# Altium footprint library RPSLib.PcbLib: 199 footprints (part 7 of 13)
Each footprint in its own frame and in the unit in brackets; x right, y up, seen from the top. Pads: shape width x height; smd on the part's side, far side on the other; paste and mask are expansions set on the pad; w line width, h text height; cw(c..) or ccw(c..) is an arc to the next point about the centre after c.
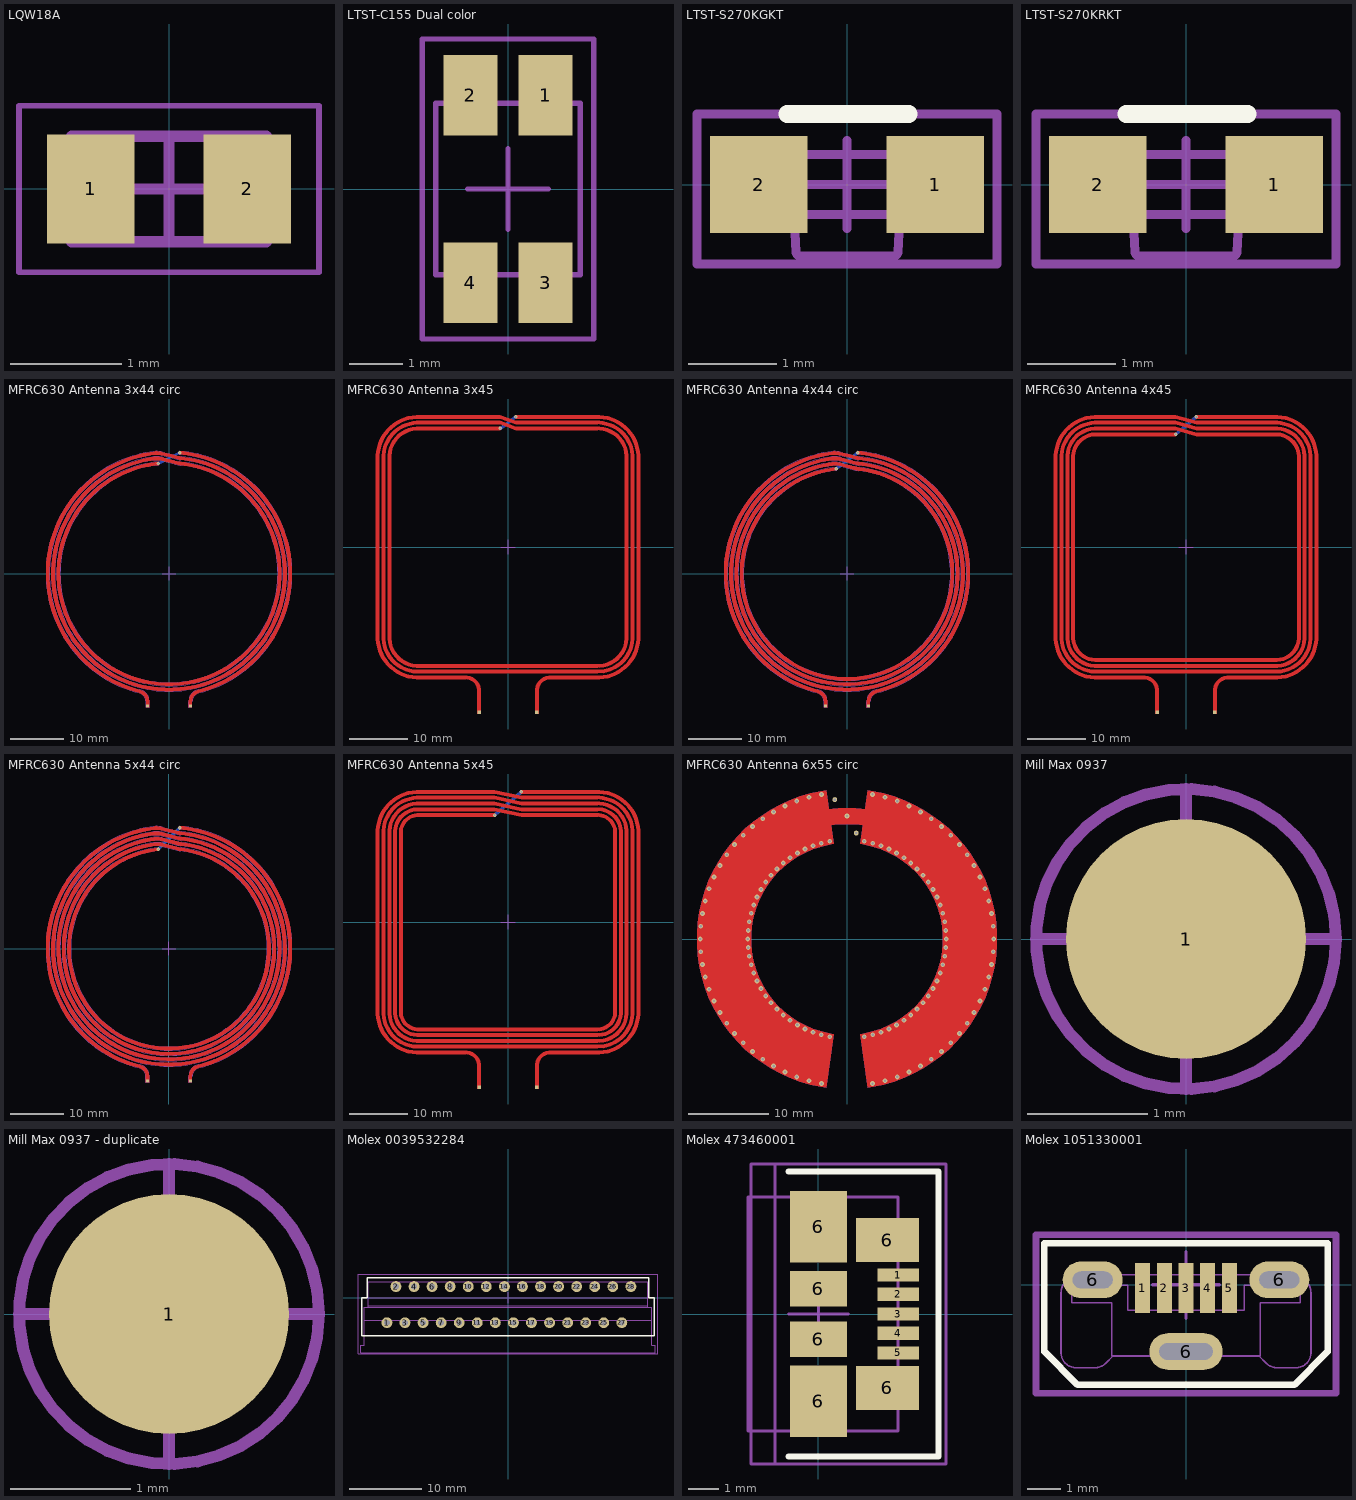
[diagram p6: the footprints below, top view; thin cyan lines are the x and y axes]

## LQW18A [mm] "Chip Inductor, 2-Leads, Body 1.60x0.80mm, IPC Medium Density"
height 0.8
pads (2):
  rect 0.79x0.98 smd paste-0.05 mask+0.07: 1(-0.705,0) 2(0.705,0)
Mechanical 13:
  lines w0.1: -0.875,-0.475 -0.875,0.475 0.875,0.475 0.875,-0.475 -0.875,-0.475
Mechanical 15:
  lines w0.05: -1.35,-0.75 -1.35,0.75 1.35,0.75 1.35,-0.75 -1.35,-0.75
  lines w0.1: -0.475,0 0.475,0 ; 0,-0.475 0,0.475
3D body "User Library-INDC1608X80-MURATA_LQW18A.step": height 0.81, standoff 0, extent -0.8,-0.45 0.8,0.45

## LTST-C155 Dual color [mm] "Dual color LED"
height 1.1
pads (4):
  rect 1x1.5 smd mask+0.07: 1(0.7,1.75) 2(-0.7,1.75) 3(0.7,-1.75) 4(-0.7,-1.75)
Mechanical 13:
  lines w0.1: -1.35,-1.6 1.35,-1.6 1.35,1.6 -1.35,1.6 -1.35,-1.6
Mechanical 15:
  lines w0.1: -0.75,0 0.75,0 ; 0,-0.75 0,0.75 ; -1.6,-2.8 -1.6,2.8 1.6,2.8 1.6,-2.8 -1.6,-2.8

## LTST-S270KGKT [mm] "LED Green Right Angle"
height 0.6
pads (2):
  rect 1.1x1.1 smd: 1(1,0) 2(-1,0)
Top Overlay:
  lines w0.2: -0.678,0.8 0.7,0.8
Mechanical 13:
  lines w0.1: -0.6,0.34 -0.6,-0.34 ; -0.528,-0.811 0,-0.811 0.528,-0.811 ; -0.528,-0.81 cw(c-0.528,-0.76) -0.578,-0.763 -0.6,-0.34 ; 0.528,-0.81 ccw(c0.528,-0.76) 0.578,-0.763 0.6,-0.34 ; 0.6,0.34 0.6,-0.34 ; -0.6,-0.34 0.6,-0.34 ; -0.6,-0.34 -0.77,-0.34 -0.825,-0.34 -0.825,0.34 -0.77,0.34 -0.495,0.34 0,0.34 0.495,0.34 0.77,0.34 0.825,0.34 0.825,-0.34 0.77,-0.34 0.6,-0.34
Mechanical 15:
  lines w0.1: -0.5,0 0.5,0 ; 0,-0.5 0,0.5 ; -1.7,-0.9 1.7,-0.9 1.7,0.8 -1.7,0.8 -1.7,-0.9
3D body "LTST-S270KGKT.stp": height 0.6, standoff 0, extent -0.825,-0.811 0.825,0.34

## LTST-S270KRKT [mm] "LED Red Right Angle"
height 0.6
pads (2):
  rect 1.1x1.1 smd: 1(1,0) 2(-1,0)
Top Overlay:
  lines w0.2: -0.678,0.8 0.7,0.8
Mechanical 13:
  lines w0.1: -0.6,0.34 -0.6,-0.34 ; -0.528,-0.811 0,-0.811 0.528,-0.811 ; -0.528,-0.81 cw(c-0.528,-0.76) -0.578,-0.763 -0.6,-0.34 ; 0.528,-0.81 ccw(c0.528,-0.76) 0.578,-0.763 0.6,-0.34 ; 0.6,0.34 0.6,-0.34 ; -0.6,-0.34 0.6,-0.34 ; -0.6,-0.34 -0.77,-0.34 -0.825,-0.34 -0.825,0.34 -0.77,0.34 -0.495,0.34 0,0.34 0.495,0.34 0.77,0.34 0.825,0.34 0.825,-0.34 0.77,-0.34 0.6,-0.34
Mechanical 15:
  lines w0.1: -0.5,0 0.5,0 ; 0,-0.5 0,0.5 ; -1.7,-0.9 1.7,-0.9 1.7,0.8 -1.7,0.8 -1.7,-0.9
3D body "LTST-S270KRKT.stp": height 0.6, standoff 0, extent -0.825,-0.811 0.825,0.34

## MFRC630 Antenna 3x44 circ [mm] "Антенна 3 витка 44 мм"
pads (2):
  rect 0.6x0.6 smd mask+0.07: 1(-4,-24.75) 2(4,-24.75)
via 2,22.612 diameter 0.6 hole 0.3
via -2,20.603 diameter 0.6 hole 0.3
Top Layer:
  region: 3.7,-25 3.7,-23.96 3.7,-23.769 3.763,-23.393 3.887,-23.031 4.069,-22.696 4.304,-22.395 4.586,-22.136 4.906,-21.928 5.256,-21.775 5.441,-21.729 6.158,-21.537 7.571,-21.082 8.95,-20.534 10.291,-19.896 11.586,-19.171 12.83,-18.362 14.018,-17.472 15.144,-16.505 16.204,-15.466 17.192,-14.359 18.105,-13.189 18.939,-11.961 19.69,-10.681 20.354,-9.353 20.928,-7.985 21.411,-6.582 21.8,-5.149 22.093,-3.694 22.289,-2.223 22.388,-0.742 22.4,0 22.389,0.692 22.304,2.073 22.133,3.446 21.878,4.805 21.54,6.147 21.12,7.465 20.618,8.755 20.039,10.011 19.382,11.229 18.652,12.404 17.851,13.532 16.981,14.608 16.047,15.628 15.052,16.589 13.999,17.487 12.893,18.318 11.737,19.079 10.537,19.767 9.297,20.38 8.021,20.915 6.714,21.37 5.382,21.744 4.03,22.035 2.662,22.241 1.974,22.313 2.026,22.911 2.734,22.848 4.14,22.636 5.529,22.337 6.898,21.953 8.24,21.485 9.55,20.936 10.825,20.306 12.057,19.599 13.244,18.817 14.381,17.964 15.462,17.042 16.485,16.055 17.445,15.006 18.338,13.901 19.161,12.742 19.911,11.535 20.585,10.284 21.181,8.993 21.696,7.669 22.128,6.315 22.475,4.937 22.737,3.54 22.912,2.129 23,0.711 23,0 23,-0.762 22.899,-2.284 22.698,-3.795 22.396,-5.29 21.997,-6.762 21.501,-8.203 20.91,-9.609 20.228,-10.973 19.457,-12.288 18.601,-13.55 17.662,-14.752 16.647,-15.889 15.558,-16.957 14.401,-17.95 13.181,-18.864 11.902,-19.696 10.572,-20.441 9.195,-21.096 7.778,-21.658 6.327,-22.126 5.587,-22.311 5.452,-22.351 5.194,-22.463 4.958,-22.617 4.751,-22.807 4.578,-23.029 4.444,-23.276 4.352,-23.542 4.306,-23.82 4.3,-23.96 4.3,-25
  region: 578 vertices and 0 holes, not listed, extent -23,-25 22,22.864
Bottom Layer:
  lines w0.6: -2,20.603 2,22.612
Mechanical 1:
  lines w0.1: -23,0 cw(c0,0) -2.813,22.827 cw(c-2.287,18.56) -1.24,22.73 0.073,22.401 1.787,21.97 ccw(c2.688,25.559) 2.301,21.879 cw(c0,0) 22,0 cw(c0,0) 0,-22 cw(c0,0) -22,0 cw(c0,0) -2.83,21.817 cw(c-2.277,17.553) -1.23,21.723 0.073,21.396 1.796,20.964 ccw(c2.697,24.552) 2.293,20.874 cw(c0,0) 21,0 cw(c0,0) 0,-21 cw(c0,0) -21,0 cw(c0,0) -2.029,20.902 -1.971,20.305 ccw(c0,0) -20.4,0 ccw(c0,0) 0,-20.4 ccw(c0,0) 20.4,0 ccw(c0,0) 2.228,20.278 cw(c2.697,24.552) 1.65,20.382 -0.073,20.814 -1.376,21.142 ccw(c-2.277,17.553) -2.753,21.222 ccw(c0,0) -21.4,0 ccw(c0,0) 0,-21.4 ccw(c0,0) 21.4,0 ccw(c0,0) 2.238,21.283 cw(c2.688,25.559) 1.641,21.388 -0.073,21.819 -1.386,22.148 ccw(c-2.287,18.56) -2.739,22.232 ccw(c0,0) -22.4,0 ccw(c0,0) -5.441,-21.729 cw(c-6,-23.96) -3.7,-23.96 -3.7,-25 -4.3,-25 -4.3,-23.96 ccw(c-6,-23.96) -5.587,-22.311 cw(c0,0) -23,0 ; 1.974,22.313 cw(c0,0) 22.4,0 cw(c0,0) 5.441,-21.729 ccw(c6,-23.96) 3.7,-23.96 3.7,-25 4.3,-25 4.3,-23.96 cw(c6,-23.96) 5.587,-22.311 ccw(c0,0) 23,0 ccw(c0,0) 2.026,22.911 1.974,22.313
Mechanical 15:
  lines w0.2: -1.25,0 1.25,0 ; 0,-1.25 0,1.25

## MFRC630 Antenna 3x45 [mm] "Антенна 3 витка 45 мм"
pads (2):
  rect 0.6x0.6 smd mask+0.07: 1(-5,-28.5) 2(5,-28.5)
via 1.3,22.5 diameter 0.6 hole 0.3
via -1.3,20.5 diameter 0.6 hole 0.3
Top Layer:
  region: 370 vertices and 0 holes, not listed, extent -22.8,-28.8 21.8,22.8
  region: 5.3,-28.8 5.3,-24.8 5.31,-24.604 5.386,-24.219 5.536,-23.857 5.754,-23.531 6.031,-23.254 6.357,-23.036 6.719,-22.886 7.104,-22.81 7.3,-22.8 15.5,-22.8 15.859,-22.8 16.572,-22.73 17.276,-22.59 17.962,-22.382 18.625,-22.107 19.257,-21.769 19.854,-21.37 20.408,-20.915 20.915,-20.408 21.37,-19.854 21.769,-19.257 22.107,-18.625 22.382,-17.962 22.59,-17.276 22.73,-16.572 22.8,-15.859 22.8,-15.5 22.8,15.5 22.8,15.859 22.73,16.572 22.59,17.276 22.382,17.962 22.107,18.625 21.769,19.257 21.37,19.854 20.915,20.408 20.408,20.915 19.854,21.37 19.257,21.769 18.625,22.107 17.962,22.382 17.276,22.59 16.572,22.73 15.859,22.8 15.5,22.8 1.3,22.8 1.3,22.2 15.5,22.2 15.829,22.192 16.483,22.127 17.128,21.999 17.757,21.808 18.365,21.557 18.944,21.247 19.491,20.881 19.999,20.464 20.464,19.999 20.881,19.491 21.247,18.944 21.557,18.365 21.808,17.757 21.999,17.128 22.127,16.483 22.192,15.829 22.2,15.5 22.2,-15.5 22.192,-15.829 22.127,-16.483 21.999,-17.128 21.808,-17.757 21.557,-18.365 21.247,-18.944 20.881,-19.491 20.464,-19.999 19.999,-20.464 19.491,-20.881 18.944,-21.247 18.365,-21.557 17.757,-21.808 17.128,-21.999 16.483,-22.127 15.829,-22.192 15.5,-22.2 7.3,-22.2 7.044,-22.2 6.542,-22.3 6.068,-22.496 5.643,-22.78 5.28,-23.143 4.996,-23.568 4.8,-24.042 4.7,-24.544 4.7,-24.8 4.7,-28.8
Bottom Layer:
  lines w0.6: -1.3,20.5 1.3,22.5
Top Solder:
  rectangle: -2.4,20 2.7,23
Mechanical 15:
  lines w0.2: -1.25,0 1.25,0 ; 0,-1.25 0,1.25

## MFRC630 Antenna 4x44 circ [mm] "Антенна 4витка 44 мм"
pads (2):
  rect 0.6x0.6 smd mask+0.07: 1(-4,-24.75) 2(4,-24.75)
via -2,19.598 diameter 0.6 hole 0.3
via 2,22.612 diameter 0.6 hole 0.3
Top Layer:
  region: 805 vertices and 0 holes, not listed, extent -23,-25 22,22.864
  region: 3.7,-25 4.3,-25 4.3,-23.96 4.306,-23.82 4.352,-23.542 4.444,-23.276 4.578,-23.029 4.751,-22.807 4.958,-22.617 5.194,-22.463 5.452,-22.351 5.587,-22.311 6.327,-22.126 7.778,-21.658 9.195,-21.096 10.572,-20.441 11.902,-19.696 13.181,-18.864 14.401,-17.95 15.558,-16.957 16.647,-15.889 17.662,-14.752 18.601,-13.55 19.457,-12.288 20.228,-10.973 20.91,-9.609 21.501,-8.203 21.997,-6.762 22.396,-5.29 22.698,-3.795 22.899,-2.284 23,-0.762 23,0 23,0.711 22.912,2.129 22.737,3.54 22.475,4.937 22.128,6.315 21.696,7.669 21.181,8.993 20.585,10.284 19.911,11.535 19.161,12.742 18.338,13.901 17.445,15.006 16.485,16.055 15.462,17.042 14.381,17.964 13.244,18.817 12.057,19.599 10.825,20.306 9.55,20.936 8.24,21.485 6.898,21.953 5.529,22.337 4.14,22.636 2.734,22.848 2.026,22.911 1.974,22.313 2.662,22.241 4.03,22.035 5.382,21.744 6.714,21.37 8.021,20.915 9.297,20.38 10.537,19.767 11.737,19.079 12.893,18.318 13.999,17.487 15.052,16.589 16.047,15.628 16.981,14.608 17.851,13.532 18.652,12.404 19.382,11.229 20.039,10.011 20.618,8.755 21.12,7.465 21.54,6.147 21.878,4.805 22.133,3.446 22.304,2.073 22.389,0.692 22.4,0 22.388,-0.742 22.289,-2.223 22.093,-3.694 21.8,-5.149 21.411,-6.582 20.928,-7.985 20.354,-9.353 19.69,-10.681 18.939,-11.961 18.105,-13.189 17.192,-14.359 16.204,-15.466 15.144,-16.505 14.018,-17.472 12.83,-18.362 11.586,-19.171 10.291,-19.896 8.95,-20.534 7.571,-21.082 6.158,-21.537 5.441,-21.729 5.256,-21.775 4.906,-21.928 4.586,-22.136 4.304,-22.395 4.069,-22.696 3.887,-23.031 3.763,-23.393 3.7,-23.769 3.7,-23.96
Bottom Layer:
  lines w0.6: -2,19.598 2,22.612
Mechanical 1:
  lines w0.1: -23,0 cw(c0,0) -2.813,22.827 cw(c-2.287,18.56) -1.24,22.73 0.073,22.401 1.787,21.97 ccw(c2.688,25.559) 2.301,21.879 cw(c0,0) 22,0 cw(c0,0) 0,-22 cw(c0,0) -22,0 cw(c0,0) -2.83,21.817 cw(c-2.277,17.553) -1.23,21.723 0.073,21.396 1.796,20.964 ccw(c2.697,24.552) 2.293,20.874 cw(c0,0) 21,0 cw(c0,0) 0,-21 cw(c0,0) -21,0 cw(c0,0) -2.849,20.806 cw(c-2.266,16.546) -1.218,20.716 0.073,20.392 1.805,19.956 ccw(c2.707,23.545) 2.284,19.869 cw(c0,0) 20,0 cw(c0,0) 0,-20 cw(c0,0) -20,0 cw(c0,0) -2.03,19.897 -1.97,19.3 ccw(c0,0) -19.4,0 ccw(c0,0) 0,-19.4 ccw(c0,0) 19.4,0 ccw(c0,0) 2.216,19.273 cw(c2.707,23.545) 1.659,19.374 -0.073,19.81 -1.364,20.134 ccw(c-2.266,16.546) -2.768,20.211 ccw(c0,0) -20.4,0 ccw(c0,0) 0,-20.4 ccw(c0,0) 20.4,0 ccw(c0,0) 2.228,20.278 cw(c2.697,24.552) 1.65,20.382 -0.073,20.814 -1.376,21.142 ccw(c-2.277,17.553) -2.753,21.222 ccw(c0,0) -21.4,0 ccw(c0,0) 0,-21.4 ccw(c0,0) 21.4,0 ccw(c0,0) 2.238,21.283 cw(c2.688,25.559) 1.641,21.388 -0.073,21.819 -1.386,22.148 ccw(c-2.287,18.56) -2.739,22.232 ccw(c0,0) -22.4,0 ccw(c0,0) -5.441,-21.729 cw(c-6,-23.96) -3.7,-23.96 -3.7,-25 -4.3,-25 -4.3,-23.96 ccw(c-6,-23.96) -5.587,-22.311 cw(c0,0) -23,0 ; 1.974,22.313 cw(c0,0) 22.4,0 cw(c0,0) 5.441,-21.729 ccw(c6,-23.96) 3.7,-23.96 3.7,-25 4.3,-25 4.3,-23.96 cw(c6,-23.96) 5.587,-22.311 ccw(c0,0) 23,0 ccw(c0,0) 2.026,22.911 1.974,22.313
Mechanical 15:
  lines w0.2: -1.25,0 1.25,0 ; 0,-1.25 0,1.25

## MFRC630 Antenna 4x45 [mm] "Антенна 4 витка 45 мм"
pads (2):
  rect 0.6x0.6 smd mask+0.07: 1(-5,-28.5) 2(5,-28.5)
via 1.8,22.5 diameter 0.6 hole 0.3
via -1.8,19.5 diameter 0.6 hole 0.3
Top Layer:
  region: 499 vertices and 0 holes, not listed, extent -22.8,-28.8 21.8,22.8
  region: 4.7,-28.8 5.3,-28.8 5.3,-24.8 5.31,-24.604 5.386,-24.219 5.536,-23.857 5.754,-23.531 6.031,-23.254 6.357,-23.036 6.719,-22.886 7.104,-22.81 7.3,-22.8 15.5,-22.8 15.859,-22.8 16.572,-22.73 17.276,-22.59 17.962,-22.382 18.625,-22.107 19.257,-21.769 19.854,-21.37 20.408,-20.915 20.915,-20.408 21.37,-19.854 21.769,-19.257 22.107,-18.625 22.382,-17.962 22.59,-17.276 22.73,-16.572 22.8,-15.859 22.8,-15.5 22.8,15.5 22.8,15.859 22.73,16.572 22.59,17.276 22.382,17.962 22.107,18.625 21.769,19.257 21.37,19.854 20.915,20.408 20.408,20.915 19.854,21.37 19.257,21.769 18.625,22.107 17.962,22.382 17.276,22.59 16.572,22.73 15.859,22.8 15.5,22.8 1.8,22.8 1.8,22.2 15.5,22.2 15.829,22.192 16.483,22.127 17.128,21.999 17.757,21.808 18.365,21.557 18.944,21.247 19.491,20.881 19.999,20.464 20.464,19.999 20.881,19.491 21.247,18.944 21.557,18.365 21.808,17.757 21.999,17.128 22.127,16.483 22.192,15.829 22.2,15.5 22.2,-15.5 22.192,-15.829 22.127,-16.483 21.999,-17.128 21.808,-17.757 21.557,-18.365 21.247,-18.944 20.881,-19.491 20.464,-19.999 19.999,-20.464 19.491,-20.881 18.944,-21.247 18.365,-21.557 17.757,-21.808 17.128,-21.999 16.483,-22.127 15.829,-22.192 15.5,-22.2 7.3,-22.2 7.044,-22.2 6.542,-22.3 6.068,-22.496 5.643,-22.78 5.28,-23.143 4.996,-23.568 4.8,-24.042 4.7,-24.544 4.7,-24.8
Bottom Layer:
  lines w0.6: -1.8,19.5 1.8,22.5
Top Solder:
  rectangle: -2.2,19 2.8,23
Mechanical 15:
  lines w0.2: -1.25,0 1.25,0 ; 0,-1.25 0,1.25

## MFRC630 Antenna 5x44 circ [mm] "Антенна 5 витков 44 мм"
pads (2):
  rect 0.6x0.6 smd mask+0.07: 1(-4,-24.75) 2(4,-24.75)
via 2,22.612 diameter 0.6 hole 0.3
via -2,18.593 diameter 0.6 hole 0.3
Top Layer:
  region: 3.7,-25 3.7,-23.96 3.7,-23.769 3.763,-23.393 3.887,-23.031 4.069,-22.696 4.304,-22.395 4.586,-22.136 4.906,-21.928 5.256,-21.775 5.441,-21.729 6.132,-21.544 7.493,-21.109 8.824,-20.589 10.119,-19.984 11.373,-19.298 12.581,-18.533 13.737,-17.693 14.838,-16.781 15.878,-15.801 16.853,-14.756 17.76,-13.651 18.594,-12.491 19.353,-11.279 20.033,-10.022 20.631,-8.724 21.146,-7.391 21.574,-6.027 21.914,-4.639 22.166,-3.232 22.327,-1.812 22.397,-0.384 22.376,1.045 22.263,2.47 22.061,3.885 21.768,5.284 21.387,6.661 20.918,8.011 20.365,9.329 19.728,10.609 19.012,11.846 18.217,13.034 17.349,14.169 16.41,15.247 15.404,16.262 14.336,17.212 13.209,18.091 12.028,18.896 10.799,19.625 9.525,20.274 8.213,20.84 6.867,21.321 5.493,21.716 4.097,22.022 2.684,22.239 1.974,22.313 2.026,22.911 2.758,22.846 4.209,22.623 5.643,22.309 7.055,21.904 8.437,21.409 9.785,20.828 11.094,20.161 12.357,19.413 13.57,18.585 14.727,17.682 15.825,16.706 16.858,15.663 17.823,14.556 18.715,13.39 19.531,12.169 20.267,10.899 20.921,9.584 21.49,8.23 21.971,6.843 22.362,5.428 22.663,3.991 22.871,2.537 22.987,1.073 23.008,-0.395 22.936,-1.861 22.771,-3.32 22.513,-4.766 22.163,-6.192 21.723,-7.593 21.195,-8.962 20.58,-10.296 19.881,-11.587 19.102,-12.832 18.245,-14.024 17.313,-15.159 16.311,-16.232 15.243,-17.239 14.112,-18.176 12.924,-19.039 11.684,-19.825 10.396,-20.53 9.065,-21.151 7.698,-21.686 6.299,-22.133 5.587,-22.311 5.452,-22.351 5.194,-22.463 4.958,-22.617 4.751,-22.807 4.578,-23.029 4.444,-23.276 4.352,-23.542 4.306,-23.82 4.3,-23.96 4.3,-25
  region: 928 vertices and 0 holes, not listed, extent -23.001,-25 22.01,22.864
Bottom Layer:
  lines w0.6: -2,18.593 2,22.612
Mechanical 1:
  lines w0.1: -5.587,-22.311 cw(c-6,-23.96) -4.3,-23.96 -4.3,-25 -3.7,-25 -3.7,-23.96 ccw(c-6,-23.96) -5.441,-21.729 cw(c0,0) -2.739,22.232 cw(c-2.287,18.56) -1.386,22.148 1.641,21.388 ccw(c2.688,25.559) 2.238,21.283 cw(c0,0) -2.753,21.222 cw(c-2.277,17.553) -1.376,21.142 1.65,20.382 ccw(c2.697,24.552) 2.228,20.278 cw(c0,0) -2.768,20.211 cw(c-2.266,16.546) -1.364,20.134 1.659,19.374 ccw(c2.707,23.545) 2.216,19.273 cw(c0,0) -2.784,19.199 cw(c-2.253,15.537) -1.351,19.126 1.67,18.366 ccw(c2.718,22.537) 2.203,18.268 cw(c0,0) -1.968,18.294 -2.032,18.891 ccw(c0,0) 2.275,18.863 cw(c2.718,22.537) 1.816,18.948 -1.205,19.708 ccw(c-2.253,15.537) -2.87,19.793 ccw(c0,0) 2.284,19.869 cw(c2.707,23.545) 1.805,19.956 -1.218,20.716 ccw(c-2.266,16.546) -2.849,20.806 ccw(c0,0) 2.293,20.874 cw(c2.697,24.552) 1.796,20.964 -1.23,21.723 ccw(c-2.277,17.553) -2.83,21.817 ccw(c0,0) 2.301,21.879 cw(c2.688,25.559) 1.787,21.97 -1.24,22.73 ccw(c-2.287,18.56) -2.813,22.827 ccw(c0,0) -5.587,-22.311 ; 1.974,22.313 cw(c0,0) 5.441,-21.729 ccw(c6,-23.96) 3.7,-23.96 3.7,-25 4.3,-25 4.3,-23.96 cw(c6,-23.96) 5.587,-22.311 ccw(c0,0) 2.026,22.911 1.974,22.313
Mechanical 15:
  lines w0.2: -1.25,0 1.25,0 ; 0,-1.25 0,1.25

## MFRC630 Antenna 5x45 [mm] "Антенна 5 витка 45 мм"
pads (2):
  rect 0.6x0.6 smd mask+0.07: 1(-5,-28.5) 2(5,-28.5)
via -2.3,18.5 diameter 0.6 hole 0.3
via 2.3,22.5 diameter 0.6 hole 0.3
Top Layer:
  region: 4.7,-28.8 5.3,-28.8 5.3,-24.8 5.31,-24.604 5.386,-24.219 5.536,-23.857 5.754,-23.531 6.031,-23.254 6.357,-23.036 6.719,-22.886 7.104,-22.81 7.3,-22.8 15.5,-22.8 15.859,-22.8 16.572,-22.73 17.276,-22.59 17.962,-22.382 18.625,-22.107 19.257,-21.769 19.854,-21.37 20.408,-20.915 20.915,-20.408 21.37,-19.854 21.769,-19.257 22.107,-18.625 22.382,-17.962 22.59,-17.276 22.73,-16.572 22.8,-15.859 22.8,-15.5 22.8,15.5 22.8,15.859 22.73,16.572 22.59,17.276 22.382,17.962 22.107,18.625 21.769,19.257 21.37,19.854 20.915,20.408 20.408,20.915 19.854,21.37 19.257,21.769 18.625,22.107 17.962,22.382 17.276,22.59 16.572,22.73 15.859,22.8 15.5,22.8 2.3,22.8 2.3,22.2 15.5,22.2 15.829,22.192 16.483,22.127 17.128,21.999 17.757,21.808 18.365,21.557 18.944,21.247 19.491,20.881 19.999,20.464 20.464,19.999 20.881,19.491 21.247,18.944 21.557,18.365 21.808,17.757 21.999,17.128 22.127,16.483 22.192,15.829 22.2,15.5 22.2,-15.5 22.192,-15.829 22.127,-16.483 21.999,-17.128 21.808,-17.757 21.557,-18.365 21.247,-18.944 20.881,-19.491 20.464,-19.999 19.999,-20.464 19.491,-20.881 18.944,-21.247 18.365,-21.557 17.757,-21.808 17.128,-21.999 16.483,-22.127 15.829,-22.192 15.5,-22.2 7.3,-22.2 7.044,-22.2 6.542,-22.3 6.068,-22.496 5.643,-22.78 5.28,-23.143 4.996,-23.568 4.8,-24.042 4.7,-24.544 4.7,-24.8
  region: 622 vertices and 0 holes, not listed, extent -22.8,-28.8 21.8,22.8
Bottom Layer:
  lines w0.6: -2.3,18.5 2.3,22.5
Top Solder:
  rectangle: -4.5,18 4.7,23
Mechanical 15:
  lines w0.2: -1.25,0 1.25,0 ; 0,-1.25 0,1.25

## MFRC630 Antenna 6x55 circ [mm] "Антенна 6 витков 35 мм"
pads (3):
  round 0.6 hole 0.3 mask+0.07: 1(-1.524,17.424) 2(1.159,13.244) 3(0,15.375)
via 18.35,0 diameter 0.6 hole 0.3
via 18.28,-1.599 diameter 0.6 hole 0.3
via 18.071,-3.186 diameter 0.6 hole 0.3
via 17.725,-4.749 diameter 0.6 hole 0.3
via 17.243,-6.276 diameter 0.6 hole 0.3
via 16.631,-7.755 diameter 0.6 hole 0.3
via 15.892,-9.175 diameter 0.6 hole 0.3
via 15.031,-10.525 diameter 0.6 hole 0.3
via 14.057,-11.795 diameter 0.6 hole 0.3
via 12.975,-12.975 diameter 0.6 hole 0.3
via 11.795,-14.057 diameter 0.6 hole 0.3
via 10.525,-15.031 diameter 0.6 hole 0.3
via 9.175,-15.892 diameter 0.6 hole 0.3
via 7.755,-16.631 diameter 0.6 hole 0.3
via 6.276,-17.243 diameter 0.6 hole 0.3
via 4.749,-17.725 diameter 0.6 hole 0.3
via 3.186,-18.071 diameter 0.6 hole 0.3
via -3.186,-18.071 diameter 0.6 hole 0.3
via -4.749,-17.725 diameter 0.6 hole 0.3
via -6.276,-17.243 diameter 0.6 hole 0.3
via -7.755,-16.631 diameter 0.6 hole 0.3
via -9.175,-15.892 diameter 0.6 hole 0.3
via -10.525,-15.031 diameter 0.6 hole 0.3
via -11.795,-14.057 diameter 0.6 hole 0.3
via -12.975,-12.975 diameter 0.6 hole 0.3
via -14.057,-11.795 diameter 0.6 hole 0.3
via -15.031,-10.525 diameter 0.6 hole 0.3
via -15.892,-9.175 diameter 0.6 hole 0.3
via -16.631,-7.755 diameter 0.6 hole 0.3
via -17.243,-6.276 diameter 0.6 hole 0.3
via -17.725,-4.749 diameter 0.6 hole 0.3
via -18.071,-3.186 diameter 0.6 hole 0.3
via -18.28,-1.599 diameter 0.6 hole 0.3
via -18.35,0 diameter 0.6 hole 0.3
via -18.28,1.599 diameter 0.6 hole 0.3
via -18.071,3.186 diameter 0.6 hole 0.3
via -17.725,4.749 diameter 0.6 hole 0.3
via -17.243,6.276 diameter 0.6 hole 0.3
via -16.631,7.755 diameter 0.6 hole 0.3
via -15.892,9.175 diameter 0.6 hole 0.3
via -15.031,10.525 diameter 0.6 hole 0.3
via -14.057,11.795 diameter 0.6 hole 0.3
via -12.975,12.975 diameter 0.6 hole 0.3
via -11.795,14.057 diameter 0.6 hole 0.3
via -10.525,15.031 diameter 0.6 hole 0.3
via -9.175,15.892 diameter 0.6 hole 0.3
via -7.755,16.631 diameter 0.6 hole 0.3
via -6.276,17.243 diameter 0.6 hole 0.3
via -4.749,17.725 diameter 0.6 hole 0.3
via -3.186,18.071 diameter 0.6 hole 0.3
via 3.186,18.071 diameter 0.6 hole 0.3
via 4.749,17.725 diameter 0.6 hole 0.3
via 6.276,17.243 diameter 0.6 hole 0.3
via 7.755,16.631 diameter 0.6 hole 0.3
via 9.175,15.892 diameter 0.6 hole 0.3
via 10.525,15.031 diameter 0.6 hole 0.3
via 11.795,14.057 diameter 0.6 hole 0.3
via 12.975,12.975 diameter 0.6 hole 0.3
via 14.057,11.795 diameter 0.6 hole 0.3
via 15.031,10.525 diameter 0.6 hole 0.3
via 15.892,9.175 diameter 0.6 hole 0.3
via 16.631,7.755 diameter 0.6 hole 0.3
via 17.243,6.276 diameter 0.6 hole 0.3
via 17.725,4.749 diameter 0.6 hole 0.3
via 18.071,3.186 diameter 0.6 hole 0.3
via 18.28,1.599 diameter 0.6 hole 0.3
via 18.35,0 diameter 0.6 hole 0.3
via 7.112,-10.157 diameter 0.6 hole 0.3
via 5.24,-11.238 diameter 0.6 hole 0.3
via 4.241,-11.652 diameter 0.6 hole 0.3
via 2.153,-12.212 diameter 0.6 hole 0.3
via 7.971,-9.499 diameter 0.6 hole 0.3
via 6.2,-10.739 diameter 0.6 hole 0.3
via 3.209,-11.977 diameter 0.6 hole 0.3
via 12.353,-1.081 diameter 0.6 hole 0.3
via 12.212,-2.153 diameter 0.6 hole 0.3
via 11.977,-3.209 diameter 0.6 hole 0.3
via 11.652,-4.241 diameter 0.6 hole 0.3
via 11.238,-5.24 diameter 0.6 hole 0.3
via 10.739,-6.2 diameter 0.6 hole 0.3
via 10.157,-7.112 diameter 0.6 hole 0.3
via 9.499,-7.971 diameter 0.6 hole 0.3
via 8.768,-8.768 diameter 0.6 hole 0.3
via -8.768,-8.768 diameter 0.6 hole 0.3
via -9.499,-7.971 diameter 0.6 hole 0.3
via -10.157,-7.112 diameter 0.6 hole 0.3
via -10.739,-6.2 diameter 0.6 hole 0.3
via -11.238,-5.24 diameter 0.6 hole 0.3
via -11.652,-4.241 diameter 0.6 hole 0.3
via -11.977,-3.209 diameter 0.6 hole 0.3
via -12.212,-2.153 diameter 0.6 hole 0.3
via -12.353,-1.081 diameter 0.6 hole 0.3
via -3.209,-11.977 diameter 0.6 hole 0.3
via -6.2,-10.739 diameter 0.6 hole 0.3
via -7.971,-9.499 diameter 0.6 hole 0.3
via -2.153,-12.212 diameter 0.6 hole 0.3
via -4.241,-11.652 diameter 0.6 hole 0.3
via -5.24,-11.238 diameter 0.6 hole 0.3
via -7.112,-10.157 diameter 0.6 hole 0.3
via -7.112,10.157 diameter 0.6 hole 0.3
via -5.24,11.238 diameter 0.6 hole 0.3
via -4.241,11.652 diameter 0.6 hole 0.3
via -2.153,12.212 diameter 0.6 hole 0.3
via -7.971,9.499 diameter 0.6 hole 0.3
via -6.2,10.739 diameter 0.6 hole 0.3
via -3.209,11.977 diameter 0.6 hole 0.3
via -12.4,0 diameter 0.6 hole 0.3
via -12.353,1.081 diameter 0.6 hole 0.3
via -12.212,2.153 diameter 0.6 hole 0.3
via -11.977,3.209 diameter 0.6 hole 0.3
via -11.652,4.241 diameter 0.6 hole 0.3
via -11.238,5.24 diameter 0.6 hole 0.3
via -10.739,6.2 diameter 0.6 hole 0.3
via -10.157,7.112 diameter 0.6 hole 0.3
via -9.499,7.971 diameter 0.6 hole 0.3
via -8.768,8.768 diameter 0.6 hole 0.3
via 8.768,8.768 diameter 0.6 hole 0.3
via 9.499,7.971 diameter 0.6 hole 0.3
via 10.157,7.112 diameter 0.6 hole 0.3
via 10.739,6.2 diameter 0.6 hole 0.3
via 11.238,5.24 diameter 0.6 hole 0.3
via 11.652,4.241 diameter 0.6 hole 0.3
via 11.977,3.209 diameter 0.6 hole 0.3
via 12.212,2.153 diameter 0.6 hole 0.3
via 12.353,1.081 diameter 0.6 hole 0.3
via 12.4,0 diameter 0.6 hole 0.3
via 3.209,11.977 diameter 0.6 hole 0.3
via 6.2,10.739 diameter 0.6 hole 0.3
via 7.971,9.499 diameter 0.6 hole 0.3
via 2.153,12.212 diameter 0.6 hole 0.3
via 4.241,11.652 diameter 0.6 hole 0.3
via 5.24,11.238 diameter 0.6 hole 0.3
via 7.112,10.157 diameter 0.6 hole 0.3
Top Layer:
  region: -2.609,-18.568 -3.274,-18.474 -4.587,-18.193 -5.876,-17.818 -7.135,-17.353 -8.357,-16.798 -9.537,-16.158 -10.667,-15.434 -11.744,-14.632 -12.76,-13.755 -13.71,-12.808 -14.591,-11.795 -15.397,-10.721 -16.124,-9.593 -16.769,-8.415 -17.328,-7.195 -17.798,-5.938 -18.177,-4.65 -18.463,-3.339 -18.654,-2.01 -18.75,-0.671 -18.75,0.671 -18.654,2.01 -18.463,3.339 -18.177,4.65 -17.798,5.938 -17.328,7.195 -16.769,8.415 -16.124,9.593 -15.397,10.721 -14.591,11.795 -13.71,12.808 -12.76,13.755 -11.744,14.632 -10.667,15.434 -9.537,16.158 -8.357,16.798 -7.135,17.353 -5.876,17.818 -4.587,18.193 -3.274,18.474 -2.609,18.568 -1.67,11.883 -2.2,11.797 -3.245,11.553 -4.264,11.217 -5.249,10.791 -6.192,10.279 -7.085,9.685 -7.922,9.013 -8.695,8.27 -9.399,7.46 -10.028,6.59 -10.577,5.668 -11.041,4.701 -11.417,3.696 -11.701,2.661 -11.892,1.605 -11.988,0.537 -11.988,-0.537 -11.892,-1.605 -11.701,-2.661 -11.417,-3.696 -11.041,-4.701 -10.577,-5.668 -10.028,-6.59 -9.399,-7.46 -8.695,-8.27 -7.922,-9.013 -7.085,-9.685 -6.192,-10.279 -5.249,-10.791 -4.264,-11.217 -3.245,-11.553 -2.2,-11.797 -1.67,-11.883
  region: 1.67,-11.883 2.2,-11.797 3.245,-11.553 4.264,-11.217 5.249,-10.791 6.192,-10.279 7.085,-9.685 7.922,-9.013 8.695,-8.27 9.399,-7.46 10.028,-6.59 10.577,-5.668 11.041,-4.701 11.417,-3.696 11.701,-2.661 11.892,-1.605 11.988,-0.537 11.988,0.537 11.892,1.605 11.701,2.661 11.417,3.696 11.041,4.701 10.577,5.668 10.028,6.59 9.399,7.46 8.695,8.27 7.922,9.013 7.085,9.685 6.192,10.279 5.249,10.791 4.264,11.217 3.245,11.553 2.2,11.797 1.67,11.883 2.609,18.568 3.274,18.474 4.587,18.193 5.876,17.818 7.135,17.353 8.357,16.798 9.537,16.158 10.667,15.434 11.744,14.632 12.76,13.755 13.71,12.808 14.591,11.795 15.397,10.721 16.124,9.593 16.769,8.415 17.328,7.195 17.798,5.938 18.177,4.65 18.463,3.339 18.654,2.01 18.75,0.671 18.75,-0.671 18.654,-2.01 18.463,-3.339 18.177,-4.65 17.798,-5.938 17.328,-7.195 16.769,-8.415 16.124,-9.593 15.397,-10.721 14.591,-11.795 13.71,-12.808 12.76,-13.755 11.744,-14.632 10.667,-15.434 9.537,-16.158 8.357,-16.798 7.135,-17.353 5.876,-17.818 4.587,-18.193 3.274,-18.474 2.609,-18.568
  region: -2.496,14.157 -2.843,16.126 -2.492,16.188 -1.783,16.282 -1.071,16.344 -0.357,16.375 0.357,16.375 1.071,16.344 1.783,16.282 2.492,16.188 2.843,16.126 2.496,14.157 2.187,14.208 1.565,14.29 0.94,14.344 0.314,14.372 -0.314,14.372 -0.94,14.344 -1.565,14.29 -2.187,14.208
Signal Layer 1:
  drawing of 1 lines, arcs and shapes, not listed
Bottom Layer:
  region: 1.67,-11.883 2.2,-11.797 3.245,-11.553 4.264,-11.217 5.249,-10.791 6.192,-10.279 7.085,-9.685 7.922,-9.013 8.695,-8.27 9.399,-7.46 10.028,-6.59 10.577,-5.668 11.041,-4.701 11.417,-3.696 11.701,-2.661 11.892,-1.605 11.988,-0.537 11.988,0.537 11.892,1.605 11.701,2.661 11.417,3.696 11.041,4.701 10.577,5.668 10.028,6.59 9.399,7.46 8.695,8.27 7.922,9.013 7.085,9.685 6.192,10.279 5.249,10.791 4.264,11.217 3.245,11.553 2.2,11.797 1.67,11.883 2.609,18.568 3.274,18.474 4.587,18.193 5.876,17.818 7.135,17.353 8.357,16.798 9.537,16.158 10.667,15.434 11.744,14.632 12.76,13.755 13.71,12.808 14.591,11.795 15.397,10.721 16.124,9.593 16.769,8.415 17.328,7.195 17.798,5.938 18.177,4.65 18.463,3.339 18.654,2.01 18.75,0.671 18.75,-0.671 18.654,-2.01 18.463,-3.339 18.177,-4.65 17.798,-5.938 17.328,-7.195 16.769,-8.415 16.124,-9.593 15.397,-10.721 14.591,-11.795 13.71,-12.808 12.76,-13.755 11.744,-14.632 10.667,-15.434 9.537,-16.158 8.357,-16.798 7.135,-17.353 5.876,-17.818 4.587,-18.193 3.274,-18.474 2.609,-18.568
  region: -2.496,14.157 -2.843,16.126 -2.492,16.188 -1.783,16.282 -1.071,16.344 -0.357,16.375 0.357,16.375 1.071,16.344 1.783,16.282 2.492,16.188 2.843,16.126 2.496,14.157 2.187,14.208 1.565,14.29 0.94,14.344 0.314,14.372 -0.314,14.372 -0.94,14.344 -1.565,14.29 -2.187,14.208
  region: -2.609,-18.568 -3.274,-18.474 -4.587,-18.193 -5.876,-17.818 -7.135,-17.353 -8.357,-16.798 -9.537,-16.158 -10.667,-15.434 -11.744,-14.632 -12.76,-13.755 -13.71,-12.808 -14.591,-11.795 -15.397,-10.721 -16.124,-9.593 -16.769,-8.415 -17.328,-7.195 -17.798,-5.938 -18.177,-4.65 -18.463,-3.339 -18.654,-2.01 -18.75,-0.671 -18.75,0.671 -18.654,2.01 -18.463,3.339 -18.177,4.65 -17.798,5.938 -17.328,7.195 -16.769,8.415 -16.124,9.593 -15.397,10.721 -14.591,11.795 -13.71,12.808 -12.76,13.755 -11.744,14.632 -10.667,15.434 -9.537,16.158 -8.357,16.798 -7.135,17.353 -5.876,17.818 -4.587,18.193 -3.274,18.474 -2.609,18.568 -1.67,11.883 -2.2,11.797 -3.245,11.553 -4.264,11.217 -5.249,10.791 -6.192,10.279 -7.085,9.685 -7.922,9.013 -8.695,8.27 -9.399,7.46 -10.028,6.59 -10.577,5.668 -11.041,4.701 -11.417,3.696 -11.701,2.661 -11.892,1.605 -11.988,0.537 -11.988,-0.537 -11.892,-1.605 -11.701,-2.661 -11.417,-3.696 -11.041,-4.701 -10.577,-5.668 -10.028,-6.59 -9.399,-7.46 -8.695,-8.27 -7.922,-9.013 -7.085,-9.685 -6.192,-10.279 -5.249,-10.791 -4.264,-11.217 -3.245,-11.553 -2.2,-11.797 -1.67,-11.883

## Mill Max 0937 [mm] "Mill Max Long stroke, Surface mount"
height 11
pads (1):
  round 2 smd mask+0.07: 1(0,0)
Mechanical 13:
  circle w0.1: c0,0 r0.915
Mechanical 15:
  circle w0.1: c0,0 r1.25
  lines w0.1: -1.25,0 1.25,0 ; 0,-1.25 0,1.25
3D body "0937-0-15-20-77-14-11-0 Contact.stp": height 10.05, standoff 0, extent -0.908,-0.913 0.915,0.913

## Mill Max 0937 - duplicate [mm] "Mill Max Long stroke, Surface mount"
height 11
pads (1):
  round 2 smd mask+0.07: 1(0,0)
Mechanical 13:
  circle w0.1: c0,0 r0.915
Mechanical 15:
  circle w0.1: c0,0 r1.25
  lines w0.1: -1.25,0 1.25,0 ; 0,-1.25 0,1.25
3D body "0937-0-15-20-77-14-11-0 Contact.stp": height 10.05, standoff 0, extent -0.908,-0.913 0.915,0.913

## Molex 0039532284 [mm] "CONN FFC TOP 28POS 1.25MM R/A"
height 5
pads (28):
  round 1.5 hole 0.8 mask+0.07: 1(-16.75,-3.45) 2(-15.5,1.55) 3(-14.25,-3.45) 4(-13,1.55) 5(-11.75,-3.45) 6(-10.5,1.55) 7(-9.25,-3.45) 8(-8,1.55) 9(-6.75,-3.45) 10(-5.5,1.55) 11(-4.25,-3.45) 12(-3,1.55) 13(-1.75,-3.45) 14(-0.5,1.55) 15(0.75,-3.45) 16(2,1.55) 17(3.25,-3.45) 18(4.5,1.55) 19(5.75,-3.45) 20(7,1.55) 21(8.25,-3.45) 22(9.5,1.55) 23(10.75,-3.45) 24(12,1.55) 25(13.25,-3.45) 26(14.5,1.55) 27(15.75,-3.45) 28(17,1.55)
Top Overlay:
  lines w0.2: -20.25,-5.25 20.25,-5.25 20.25,0 19.5,0 19.5,2.75 -19.5,2.75 -19.5,0 -20.25,0 -20.25,-5.25
Mechanical 2:
  circle w0.05: c-16.75,-3.45 r0.4
  circle w0.05: c-15.5,1.55 r0.4
  circle w0.05: c-13,1.55 r0.4
  circle w0.05: c-11.75,-3.45 r0.4
  circle w0.05: c-9.25,-3.45 r0.4
  circle w0.05: c-6.75,-3.45 r0.4
  circle w0.05: c-5.5,1.55 r0.4
  circle w0.05: c-3,1.55 r0.4
  circle w0.05: c-0.5,1.55 r0.4
  circle w0.05: c0.75,-3.45 r0.4
  circle w0.05: c3.25,-3.45 r0.4
  circle w0.05: c4.5,1.55 r0.4
  circle w0.05: c7,1.55 r0.4
  circle w0.05: c9.5,1.55 r0.4
  circle w0.05: c10.75,-3.45 r0.4
  circle w0.05: c13.25,-3.45 r0.4
  circle w0.05: c15.76,-3.45 r0.4
  circle w0.05: c17,1.55 r0.4
  circle w0.05: c-14.25,-3.45 r0.4
  circle w0.05: c-10.5,1.55 r0.4
  circle w0.05: c-1.75,-3.45 r0.4
  circle w0.05: c-4.25,-3.45 r0.4
  circle w0.05: c-8,1.55 r0.4
  circle w0.05: c5.75,-3.45 r0.4
  circle w0.05: c2,1.55 r0.4
  circle w0.05: c8.25,-3.45 r0.4
  circle w0.05: c12,1.55 r0.4
  circle w0.05: c14.5,1.55 r0.4
  lines w0.05: -19.875,-7.6 19.875,-7.6 ; -19.875,-3.1 19.875,-3.1 ; -19.325,0 19.325,0
Mechanical 13:
  lines w0.05: -19.325,-1.3 -19.325,-1.1 ; 19.325,-1.3 19.325,-1.1 ; -19.325,-1.1 19.325,-1.1 ; -19.325,-1.1 -19.325,2.2 19.325,2.2 19.325,-1.1 ; -20.375,-7.6 20.375,-7.6 20.375,-6.6 19.875,-6.6 19.875,-1.3 -19.875,-1.3 -19.875,-6.6 -20.375,-6.6 -20.375,-7.6
Mechanical 15:
  lines w0.1: -0.75,0 0.75,0 ; 0,-0.75 0,0.75 ; -20.75,-7.75 -20.75,3.25 20.75,3.25 20.75,-7.75 -20.75,-7.75
3D body "Molex FPC.stp": height 5.4, standoff -3.5, extent -20.375,-7.6 20.375,2.2

## Molex 473460001 [mm]
height 2.5
pads (11):
  rect 1.38x0.45 smd mask+0.07: 1(2.66,1.3) 2(2.66,0.65) 3(2.66,0) 4(2.66,-0.65) 5(2.66,-1.3)
  rect 1.9x2.38 smd mask+0.07: 6(0,-2.912) 6(0,2.912)
  rect 1.9x1.18 smd mask+0.07: 6(0,-0.837) 6(0,0.838)
  rect 2.1x1.47 smd mask+0.07: 6(2.3,-2.462) 6(2.3,2.463)
Top Overlay:
  lines w0.2: -1,-4.75 4,-4.75 4,4.75 -1,4.75
Mechanical 13:
  lines w0.1: -2.35,-3.9 -2.35,3.9 2.65,3.9 2.65,-3.9 -2.35,-3.9
Mechanical 15:
  lines w0.1: -1.45,-5 -1.45,5 ; -1,0 1,0 ; 0,-1 0,1 ; -2.25,-5 4.25,-5 4.25,5 -2.25,5 -2.25,-5
3D body "Molex 47346-001.stp": height 2.68, standoff -0.03, extent -2.35,-3.9 2.65,3.9

## Molex 1051330001 [mm] "Micro USB-B Vertical"
height 6
pads (8):
  rect 0.45x1.5 smd mask+0.07: 1(-1.3,-0.1) 2(-0.65,-0.1) 3(0,-0.1) 4(0.65,-0.1) 5(1.3,-0.1)
  oval 1.8x1.1 hole 0.5 slot 1.2 at 0 deg mask+0.07: 6(-2.8,0.15) 6(2.8,0.15)
  oval 2.2x1.1 hole 0.5 slot 1.6 at 0 deg mask+0.07: 6(0,-2)
Top Overlay:
  lines w0.2: -4.25,-2 -4.25,1.25 4.25,1.25 4.25,-2 3.25,-3 -3.25,-3 -4.25,-2
Mechanical 13:
  lines w0.05: -1.425,0.3 -1.425,0.39 -1.175,0.39 -1.175,0.3 ; -0.775,0.3 -0.775,0.39 -0.525,0.39 -0.525,0.3 ; -0.125,0.3 -0.125,0.39 0,0.39 0.125,0.39 0.125,0.3 ; 0.525,0.3 0.525,0.39 0.775,0.39 0.775,0.3 ; 1.175,0.3 1.175,0.39 1.425,0.39 1.425,0.3 ; -2.23,-2.135 -0.6,-2.135 -0.6,-1.85 0,-1.85 0.6,-1.85 0.6,-2.135 2.23,-2.135 ; -2.23,-2.135 -2.23,-0.535 -3.43,-0.535 -3.43,-0.365 cw(c-3.08,-0.365) -3.08,-0.015 -1.75,-0.015 -1.75,-0.76 -1.425,-0.76 -1.175,-0.76 -0.775,-0.76 -0.525,-0.76 -0.125,-0.76 0,-0.76 0.125,-0.76 0.525,-0.76 0.775,-0.76 1.175,-0.76 1.425,-0.76 1.75,-0.76 1.75,-0.015 3.08,-0.015 cw(c3.08,-0.365) 3.43,-0.365 3.43,-0.535 2.23,-0.535 2.23,-2.135 ; -2.23,-2.135 -2.19,-2.135 -2.408,-2.353 cw(c-2.726,-2.035) -2.726,-2.485 -2.75,-2.485 -3.3,-2.485 cw(c-3.3,-2.035) -3.75,-2.035 -3.75,-0.25 cw(c-3.2,-0.25) -3.33,0.284 -3.05,0.3 -2.55,0.3 0,0.3 2.55,0.3 3.05,0.3 3.33,0.284 cw(c3.2,-0.25) 3.75,-0.25 3.75,-2.035 cw(c3.3,-2.035) 3.3,-2.485 2.75,-2.485 2.726,-2.485 cw(c2.726,-2.035) 2.408,-2.353 2.19,-2.135 2.23,-2.135
Mechanical 15:
  lines w0.1: -1,0 1,0 ; 0,-1 0,1
  lines w0.2: -4.5,-3.25 -4.5,1.5 4.5,1.5 4.5,-3.25 -4.5,-3.25
3D body "1051330001.stp": height 6.66, standoff -2.35, extent -4.025,-2.485 3.975,0.53